# Altium footprint library AltiumLibraries.PcbLib: 247 footprints (part 16 of 16)
Each footprint in its own frame and in the unit in brackets; x right, y up, seen from the top. Pads: shape width x height; smd on the part's side, far side on the other; paste and mask are expansions set on the pad; w line width, h text height; cw(c..) or ccw(c..) is an arc to the next point about the centre after c.
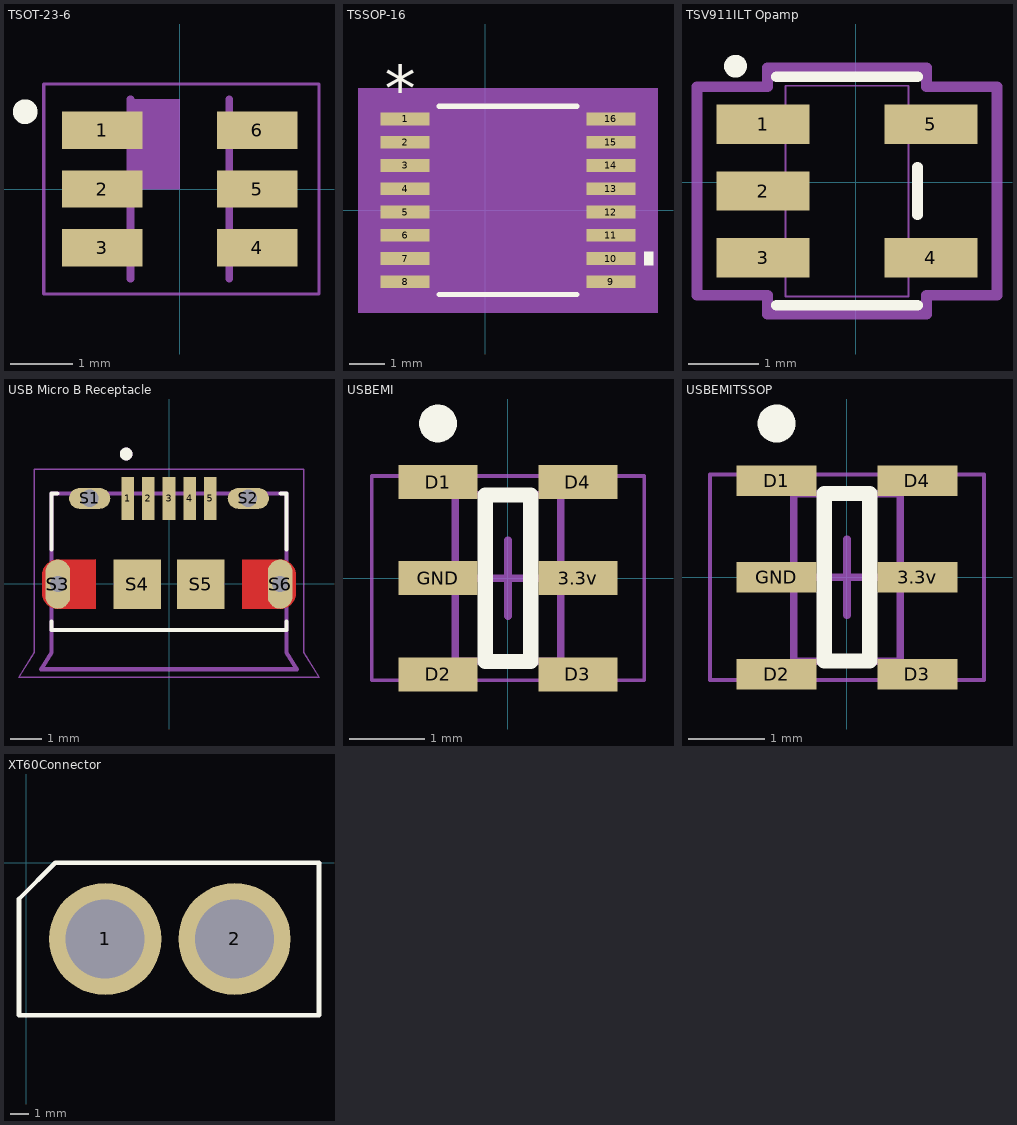
[diagram p15: the footprints below, top view; thin cyan lines are the x and y axes]

## TSOT-23-6 [mm] "SOT-23-6 Thin"
pads (6):
  rect 1.3x0.6 smd: 1(-1.255,0.95) 2(-1.255,0) 3(-1.255,-0.95) 4(1.255,-0.95) 5(1.255,0) 6(1.255,0.95)
Top Overlay:
  circle w0.2: c-2.5,1.25 r0.1
Mechanical 13:
  region: 0,0 -0.8,0 -0.8,1.45 0,1.45
  lines w0.127: -0.8,-1.45 -0.8,1.45 ; 0.8,-1.45 0.8,1.45
Mechanical 15:
  lines w0.05: -2.2,-1.7 -2.2,1.7 2.25,1.7 2.25,-1.7 -2.2,-1.7
3D body "TPS563200DDCR.stp": height 0.97, standoff 0, extent -1.4,-1.45 1.4,1.45

## TSSOP-16 [mil]
pads (16):
  rect 53.5x14 smd paste+0 mask+0: 1(-88.25,100.57) 2(-88.25,74.98) 3(-88.25,49.39) 4(-88.25,23.8) 5(-88.25,-1.8) 6(-88.25,-27.39) 7(-88.25,-52.98) 8(-88.25,-78.57) 9(138.25,-78.57) 10(138.25,-52.98) 11(138.25,-27.39) 12(138.25,-1.8) 13(138.25,23.8) 14(138.25,49.39) 15(138.25,74.98) 16(138.25,100.57)
Top Overlay:
  region: 175,-45.48 185,-45.48 185,-60.48 175,-60.48
  lines w6: -50.38,-92.5 100.39,-92.5 ; -50.38,114.5 100.39,114.5
  text "*" at -110.75,109.57 h50
Mechanical 5:
  region: 190,-112.5 -140,-112.5 -140,134.5 190,134.5
Mechanical 13:
  lines w0: 13,109.5 ccw(c25,109.5) 37,109.5
  lines w1: -101,-84.57 -61.5,-84.57 -61.5,-72.57 -101,-72.57 -101,-84.57 ; -101,-58.98 -61.5,-58.98 -61.5,-46.98 -101,-46.98 -101,-58.98 ; -101,-33.39 -61.5,-33.39 -61.5,-21.39 -101,-21.39 -101,-33.39 ; -101,-7.8 -61.5,-7.8 -61.5,4.2 -101,4.2 -101,-7.8 ; -101,17.8 -61.5,17.8 -61.5,29.8 -101,29.8 -101,17.8 ; -101,43.39 -61.5,43.39 -61.5,55.39 -101,55.39 -101,43.39 ; -101,68.98 -61.5,68.98 -61.5,80.98 -101,80.98 -101,68.98 ; -101,94.57 -61.5,94.57 -61.5,106.57 -101,106.57 -101,94.57 ; -61.5,-87.5 -61.5,109.5 111.5,109.5 111.5,-87.5 -61.5,-87.5 ; 111.5,-84.57 151,-84.57 151,-72.57 111.5,-72.57 111.5,-84.57 ; 111.5,-58.98 151,-58.98 151,-46.98 111.5,-46.98 111.5,-58.98 ; 111.5,-33.39 151,-33.39 151,-21.39 111.5,-21.39 111.5,-33.39 ; 111.5,-7.8 151,-7.8 151,4.2 111.5,4.2 111.5,-7.8 ; 111.5,17.8 151,17.8 151,29.8 111.5,29.8 111.5,17.8 ; 111.5,43.39 151,43.39 151,55.39 111.5,55.39 111.5,43.39 ; 111.5,68.98 151,68.98 151,80.98 111.5,80.98 111.5,68.98 ; 111.5,94.57 151,94.57 151,106.57 111.5,106.57 111.5,94.57
  text "*" at -59,56.5 h50
Mechanical 15:
  region: -71.5,-95.57 -125,-95.57 -125,117.57 -71.5,117.57 -71.5,119.5 121.5,119.5 121.5,117.57 175,117.57 175,-95.57 121.5,-95.57 121.5,-97.5 -71.5,-97.5
  lines w6: -125,-95.57 -71.5,-95.57 -71.5,-97.5 121.5,-97.5 121.5,-95.57 175,-95.57 175,117.57 121.5,117.57 121.5,119.5 -71.5,119.5 -71.5,117.57 -125,117.57 -125,-95.57
3D body "TSSOP-16_ONS.step": height 47.09, standoff 0, extent -100.99,-87.51 150.98,109.5
3D body "TSSOP-16_ONS.step": height 47.09, standoff 0, extent -100.98,-87.5 150.98,109.5

## TSV911ILT Opamp [mil] "Op Amp Single"
pads (5):
  rect 52x22 smd paste+0: 1(-51.88,32.44) 2(-51.88,-4.96) 3(-51.88,-42.36) 4(42.12,-42.36)
  rect 52x22 smd: 5(42.12,32.44)
Top Overlay:
  circle w10: c-67.32,64.96 r1.38
  lines w6: -44.38,-68.96 34.62,-68.96 ; -44.38,59.04 34.62,59.04 ; 34.62,-18.26 34.62,8.34
Mechanical 13:
  lines w1: -63.88,-52.36 -63.88,-32.36 -39.38,-32.36 -39.38,-52.36 -63.88,-52.36 ; -63.88,-14.96 -63.88,5.04 -39.38,5.04 -39.38,-14.96 -63.88,-14.96 ; -63.88,22.44 -63.88,42.44 -39.38,42.44 -39.38,22.44 -63.88,22.44 ; -39.38,-63.96 29.62,-63.96 29.62,54.04 -39.38,54.04 -39.38,-63.96 ; 29.62,-52.36 29.62,-32.36 54.12,-32.36 54.12,-52.36 29.62,-52.36 ; 29.62,22.44 29.62,42.44 54.12,42.44 54.12,22.44 29.62,22.44
Mechanical 15:
  lines w6: -88.88,-63.36 -49.38,-63.36 -49.38,-73.96 39.62,-73.96 39.62,-63.36 79.12,-63.36 79.12,53.44 39.62,53.44 39.62,64.04 -49.38,64.04 -49.38,53.44 -88.88,53.44 -88.88,-63.36
3D body "SOT23-5_STM.step": height 57.09, standoff 0, extent -63.89,-63.97 54.14,54.06
3D body: height 10, standoff 0, extent -4.88,-4.96 5.12,5.04

## USB Micro B Receptacle [mm] "CONN RCPT USB2.0 MICRO B SMD R/A"
pads (11):
  rect 0.4x1.35 smd: 1(-1.3,2.69) 2(-0.65,2.69) 3(0,2.69) 4(0.65,2.69) 5(1.3,2.69)
  oval 1.3x0.65 hole 0.55: S1(-2.5,2.69) S2(2.5,2.69)
  oval 0.775x1.55 hole 0.5: S3(-3.5,-0.01) S6(3.5,-0.01)
  rect 1.5x1.55 smd: S4(-1,-0.01) S5(1,-0.01)
Top Layer:
  region: 193 vertices and 0 holes, not listed, extent -4,-0.785 -2.3,0.77
  region: 193 vertices and 0 holes, not listed, extent 2.3,-0.79 4,0.765
Top Overlay:
  circle w0.2: c-1.35,4.09 r0.1
  lines w0.127: -3.7,-1.19 -3.7,-1.46 3.7,-1.46 3.7,-1.19 ; -3.7,1.085 -3.7,2.84 -3.52,2.84 ; 3.52,2.84 3.7,2.84 3.7,1.085
Top Paste:
  drawing of 6 lines, arcs and shapes, not listed
Top Solder:
  region: -3.6,0.865 -2.2,0.865 -2.2,-0.885 -3.6,-0.885 -3.626,-0.884 -3.652,-0.882 -3.678,-0.879 -3.704,-0.874 -3.729,-0.868 -3.755,-0.861 -3.779,-0.852 -3.803,-0.842 -3.827,-0.831 -3.85,-0.818 -3.872,-0.804 -3.894,-0.79 -3.915,-0.774 -3.935,-0.757 -3.954,-0.739 -3.972,-0.72 -3.989,-0.7 -4.005,-0.679 -4.019,-0.657 -4.033,-0.635 -4.046,-0.612 -4.057,-0.588 -4.067,-0.564 -4.076,-0.54 -4.083,-0.514 -4.089,-0.489 -4.094,-0.463 -4.097,-0.437 -4.099,-0.411 -4.1,-0.385 -4.1,0.365 -4.099,0.391 -4.097,0.417 -4.094,0.443 -4.089,0.469 -4.083,0.494 -4.076,0.52 -4.067,0.544 -4.057,0.568 -4.046,0.592 -4.033,0.615 -4.019,0.637 -4.005,0.659 -3.989,0.68 -3.972,0.7 -3.954,0.719 -3.935,0.737 -3.915,0.754 -3.894,0.77 -3.872,0.784 -3.85,0.798 -3.827,0.811 -3.803,0.822 -3.779,0.832 -3.755,0.841 -3.729,0.848 -3.704,0.854 -3.678,0.859 -3.652,0.862 -3.626,0.864
  region: 3.6,-0.885 2.2,-0.885 2.2,0.865 3.6,0.865 3.626,0.864 3.652,0.862 3.678,0.859 3.704,0.854 3.729,0.848 3.755,0.841 3.779,0.832 3.803,0.822 3.827,0.811 3.85,0.798 3.872,0.784 3.894,0.77 3.915,0.754 3.935,0.737 3.954,0.719 3.972,0.7 3.989,0.68 4.005,0.659 4.019,0.637 4.033,0.615 4.046,0.592 4.057,0.568 4.067,0.544 4.076,0.52 4.083,0.494 4.089,0.469 4.094,0.443 4.097,0.417 4.099,0.391 4.1,0.365 4.1,-0.385 4.099,-0.411 4.097,-0.437 4.094,-0.463 4.089,-0.489 4.083,-0.514 4.076,-0.54 4.067,-0.564 4.057,-0.588 4.046,-0.612 4.033,-0.635 4.019,-0.657 4.005,-0.679 3.989,-0.7 3.972,-0.72 3.954,-0.739 3.935,-0.757 3.915,-0.774 3.894,-0.79 3.872,-0.804 3.85,-0.818 3.827,-0.831 3.803,-0.842 3.779,-0.852 3.755,-0.861 3.729,-0.868 3.704,-0.874 3.678,-0.879 3.652,-0.882 3.626,-0.884
Mechanical 1:
  lines w0: -3.75,-0.335 ccw(c-3.5,-0.335) -3.25,-0.335 -3.25,0.315 ccw(c-3.5,0.315) -3.75,0.315 -3.75,-0.335 ; -2.65,2.415 cw(c-2.65,2.69) -2.65,2.965 -2.35,2.965 cw(c-2.35,2.69) -2.35,2.415 -2.65,2.415 ; 2.35,2.415 cw(c2.35,2.69) 2.35,2.965 2.65,2.965 cw(c2.65,2.69) 2.65,2.415 2.35,2.415 ; 3.25,-0.335 ccw(c3.5,-0.335) 3.75,-0.335 3.75,0.315 ccw(c3.5,0.315) 3.25,0.315 3.25,-0.335
Mechanical 13:
  circle w0.2: c-1.35,4.09 r0.1
  circle w0.2: c-1.35,4.09 r0.1
  lines w0.127: -4.025,-2.69 -3.7,-2.16 ; -4.025,-2.69 4.025,-2.69 ; -4.025,-2.69 -3.7,-2.16 ; -4.025,-2.69 4.025,-2.69 ; -3.7,-2.16 -3.7,-1.46 ; -3.7,-2.16 -3.7,-1.46 ; -3.7,-1.46 3.7,-1.46 ; -3.7,-1.46 -3.7,2.84 ; -3.7,-1.46 3.7,-1.46 ; -3.7,-1.46 -3.7,2.84 ; -3.7,2.84 3.7,2.84 ; -3.7,2.84 3.7,2.84 ; 3.7,-2.16 4.025,-2.69 ; 3.7,-2.16 3.7,-1.46 ; 3.7,-2.16 4.025,-2.69 ; 3.7,-2.16 3.7,-1.46 ; 3.7,-1.46 3.7,2.84 ; 3.7,-1.46 3.7,2.84
  text "PCB END" at -1.95,-2.36 h1.88
  text "PCB END" at -1.95,-2.36 h1.88
Mechanical 15:
  lines w0.05: -4.725,-2.94 4.725,-2.94 4.25,-2.16 4.25,3.615 -4.25,3.615 -4.25,-2.16 -4.725,-2.94
3D body "10118194-0001LF--3DModel-STEP-56544.STEP": height 2.87, standoff -0.4, extent -4.005,-2.74 4.045,2.79

## USBEMI [mm] "RC (Pi) EMI Filter 2nd Order Low Pass 2 Channel R = 33Ohms, C = 47pF  6-TSSOP, SC-88, SOT-363"
height 1.1
pads (6):
  rect 1.05x0.45 smd: 3.3v(0.925,0) D1(-0.925,1.27) D2(-0.925,-1.27) D3(0.925,-1.27) D4(0.925,1.27) GND(-0.925,0)
Top Overlay:
  circle w0.25: c-0.925,2.045 r0.125
  lines w0.2: -0.3,-1.1 -0.3,1.1 0.3,1.1 0.3,-1.1 -0.3,-1.1
Mechanical 13:
  lines w0.1: -0.7,-1.1 -0.7,1.1 0.7,1.1 0.7,-1.1 -0.7,-1.1
Mechanical 15:
  lines w0.05: -1.8,-1.35 -1.8,1.35 1.8,1.35 1.8,-1.35 -1.8,-1.35
  lines w0.1: -0.5,0 0.5,0 ; 0,-0.5 0,0.5
3D body: height 1.1, standoff 0.8, extent -0.7,-1.1 0.7,1.1

## USBEMITSSOP [mm] "RC (Pi) EMI Filter 2nd Order Low Pass 2 Channel R = 33Ohms, C = 47pF  6-TSSOP, SC-88, SOT-363"
height 1.1
pads (6):
  rect 1.05x0.4 smd: 3.3v(0.925,0) D1(-0.925,1.27) D2(-0.925,-1.27) D3(0.925,-1.27) D4(0.925,1.27) GND(-0.925,0)
Top Overlay:
  circle w0.25: c-0.925,2.02 r0.125
  lines w0.2: -0.3,-1.1 0.3,-1.1 0.3,1.1 -0.3,1.1 -0.3,-1.1
Mechanical 13:
  lines w0.1: -0.7,-1.1 0.7,-1.1 0.7,1.1 -0.7,1.1 -0.7,-1.1
Mechanical 15:
  lines w0.05: -1.8,-1.35 1.8,-1.35 1.8,1.35 -1.8,1.35 -1.8,-1.35
  lines w0.1: -0.5,0 0.5,0 ; 0,-0.5 0,0.5
3D body: height 1.1, standoff 0.1, extent -0.7,-1.1 0.7,1.1

## XT60Connector [mm]
pads (2):
  round 6.25 hole 4.4: 1(4.4,-4.25) 2(11.6,-4.25)
Top Overlay:
  lines w0.254: 7.75,0 1.624,0 ; 1.624,0 16.3,0 16.3,-8.5 -0.4,-8.5 -0.4,-2.024 1.624,0
3D body "XT-60_MalePin_FemaleSocket.STEP": height 16.25, standoff -4.95, extent -0.25,-8.3 16.05,-0.1